# Altium footprint library Power_Lib_Altium.PcbLib: 383 footprints (part 17 of 24)
Each footprint in its own frame and in the unit in brackets; x right, y up, seen from the top. Pads: shape width x height; smd on the part's side, far side on the other; paste and mask are expansions set on the pad; w line width, h text height; cw(c..) or ccw(c..) is an arc to the next point about the centre after c.
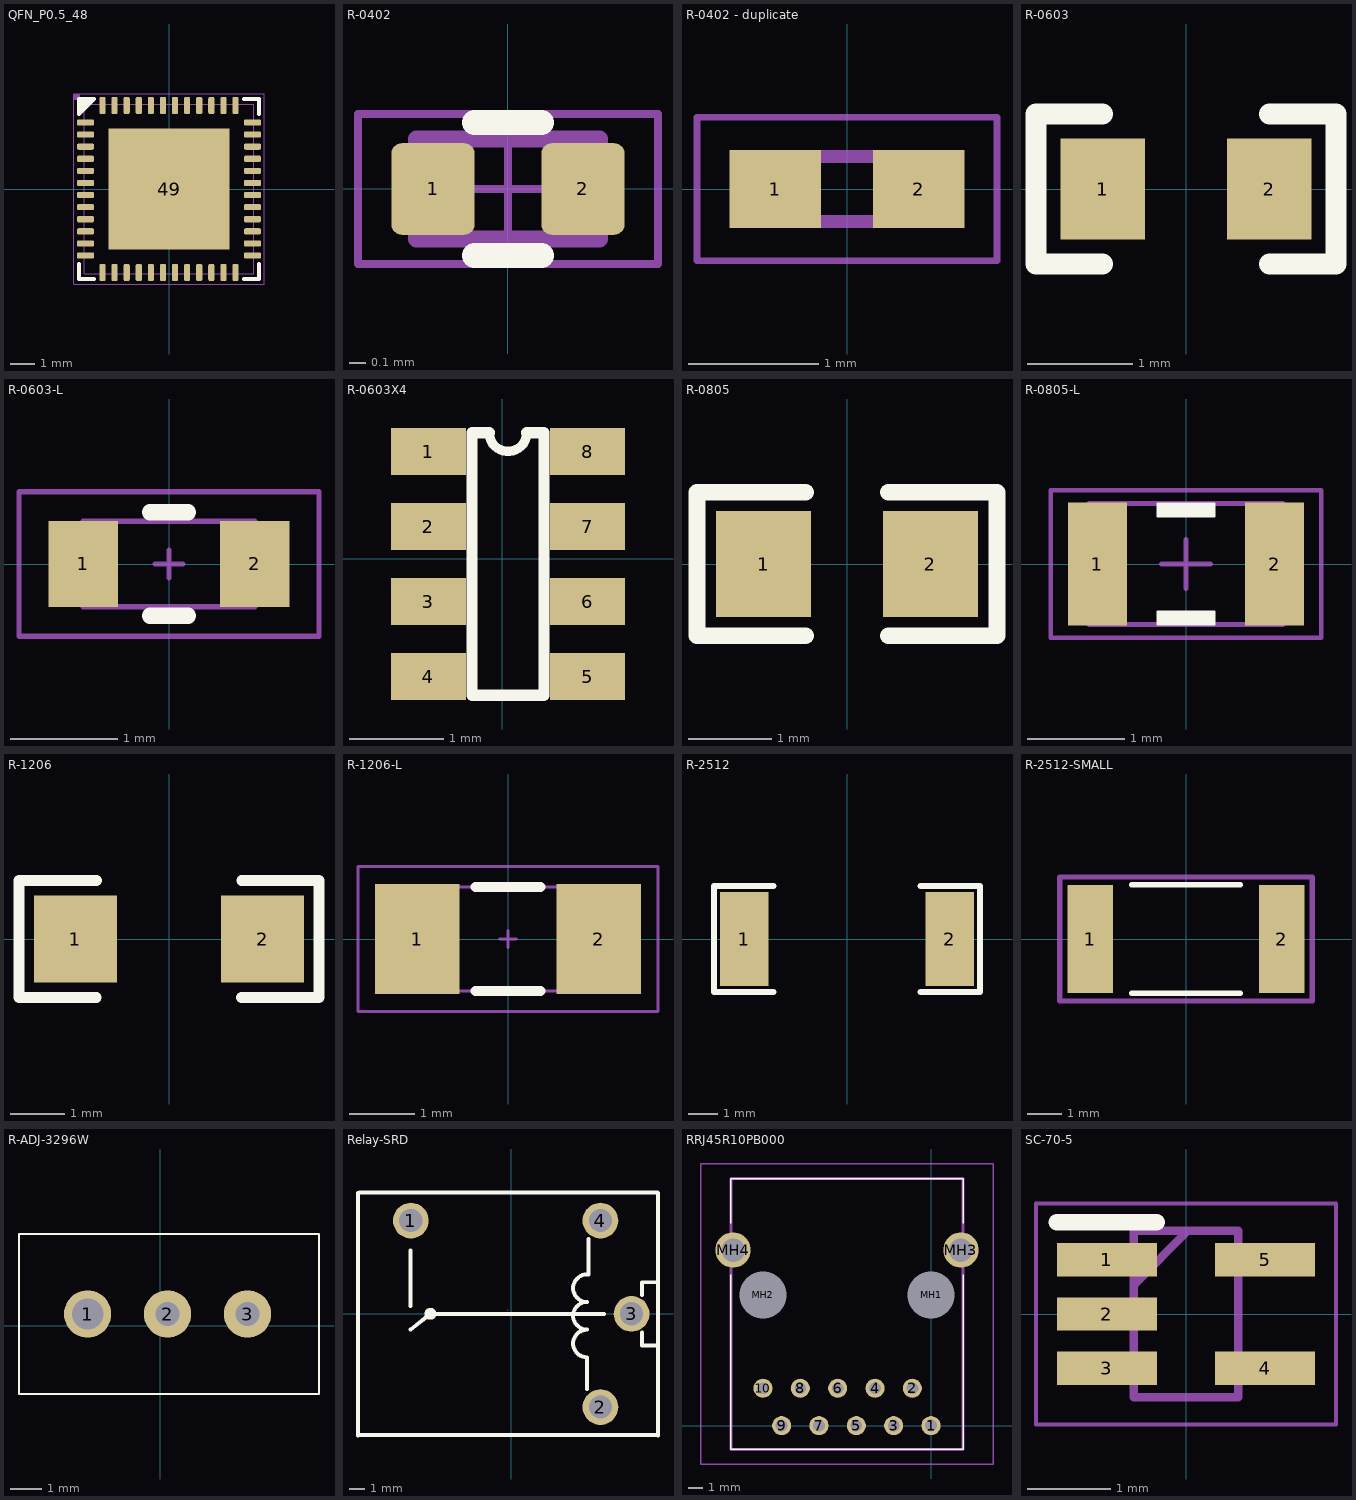
[diagram p16: the footprints below, top view; thin cyan lines are the x and y axes]

## QFN_P0.5_48 [mil]
height 21.65
pads (49):
  rrect50% 28x10 smd: 1(-136,108.27) 2(-136,88.58) 3(-136,68.9) 4(-136,49.21) 5(-136,29.53) 6(-136,9.84) 7(-136,-9.84) 8(-136,-29.53) 9(-136,-49.21) 10(-136,-68.9) 11(-136,-88.58) 12(-136,-108.27) 25(136,-108.27) 26(136,-88.58) 27(136,-68.9) 28(136,-49.21) 29(136,-29.53) 30(136,-9.84) 31(136,9.84) 32(136,29.53) 33(136,49.21) 34(136,68.9) 35(136,88.58) 36(136,108.27)
  rrect50% 10x28 smd: 13(-108.27,-136) 14(-88.58,-136) 15(-68.9,-136) 16(-49.21,-136) 17(-29.53,-136) 18(-9.84,-136) 19(9.84,-136) 20(29.53,-136) 21(49.21,-136) 22(68.9,-136) 23(88.58,-136) 24(108.27,-136) 37(108.27,136) 38(88.58,136) 39(68.9,136) 40(49.21,136) 41(29.53,136) 42(9.84,136) 43(-9.84,136) 44(-29.53,136) 45(-49.21,136) 46(-68.9,136) 47(-88.58,136) 48(-108.27,136)
  rect 196.85x196.85 smd: 49(0,0)
Top Overlay:
  region: -146.67,146.67 -122,146.67 -146.67,122
  lines w6: -146.67,-122 -146.67,-146.67 -122,-146.67 ; 122,-146.67 146.67,-146.67 146.67,-122 ; 122,146.67 146.67,146.67 146.67,122 ; -146.67,122 -122,146.67 -146.67,146.67 -146.67,122
Top Solder:
  rectangle: -150,-108.27 -122,108.27
  region: 108.27,-150 108.27,-122 -108.27,-122 -108.27,-150
  region: 150,108.27 122,108.27 122,-108.27 150,-108.27
  region: -108.27,150 -108.27,122 108.27,122 108.27,150
Mechanical 13:
  lines w2: -10,0 10,0 ; 0,-10 0,10 ; -137.79,-137.8 -137.79,137.8 137.8,137.8 137.8,-137.8 -137.79,-137.8
Mechanical 14:
  region: -155,155 -145,155 -145,150 -145,149.01 -145.76,147.17 -147.17,145.76 -149.01,145 -150,145 -155,145
  lines w2: -155,-155 155,-155 155,155 -155,155 -155,-155
3D body "QFN50P700X700X55-48L.step": height 21.65, standoff 0, extent -138.58,-138.58 138.58,138.59

## R-0402 [mm]
pads (2):
  rrect25% 0.5x0.55 smd: 1(-0.45,0) 2(0.45,0)
Top Overlay:
  lines w0.15: -0.2,-0.4 0.2,-0.4 ; -0.2,0.4 0.2,0.4
Top Courtyard:
  lines w0.05: -0.275,0 0.275,0 ; 0,-0.275 0,0.275 ; -0.9,-0.45 0.9,-0.45 0.9,0.45 -0.9,0.45 -0.9,-0.45
Top Assembly:
  lines w0.1: -0.55,-0.3 -0.55,0.3 0.55,0.3 0.55,-0.3 -0.55,-0.3
3D body "CAPC1005X60N EIA 0402.STEP": height 0.6, standoff 0, extent -0.5,-0.25 0.5,0.25

## R-0402 - duplicate [mm]
pads (2):
  rect 0.7x0.6 smd: 1(-0.55,0) 2(0.55,0)
Mechanical 13:
  lines w0.1: -0.5,-0.25 -0.5,0.25 0.5,0.25 0.5,-0.25 -0.5,-0.25
Mechanical 15:
  lines w0.05: -1.15,-0.55 -1.15,0.55 1.15,0.55 1.15,-0.55 -1.15,-0.55
3D body "CPF0402B10K5E.stp": height 0.35, standoff 0, extent -0.5,-0.25 0.5,0.25

## R-0603 [mm]
pads (2):
  rect 0.8x0.96 smd: 1(-0.79,0) 2(0.79,0)
Top Overlay:
  lines w0.2: -0.79,-0.711 -1.422,-0.711 -1.422,0.711 -0.79,0.711 ; 0.79,-0.711 1.422,-0.711 1.422,0.711 0.79,0.711
3D body "R_0603.STEP": height 0.41, standoff -0.01, extent -0.762,-0.381 0.762,0.381

## R-0603-L [mm]
height 0.35
pads (2):
  rect 0.65x0.8 smd: 1(-0.8,0) 2(0.8,0)
Top Overlay:
  lines w0.152: -0.178,-0.483 0.178,-0.483 ; -0.178,0.483 0.178,0.483
Mechanical 13:
  lines w0.051: -0.127,0 0.127,0 ; 0,-0.127 0,0.127 ; -0.8,-0.4 -0.8,0.4 0.8,0.4 0.8,-0.4 -0.8,-0.4
Mechanical 14:
  lines w0.051: -1.4,-0.675 -1.4,0.675 1.4,0.675 1.4,-0.675 -1.4,-0.675
3D body "RESC1608X05L.step": height 0.45, standoff 0, extent -0.8,-0.4 0.8,0.4

## R-0603X4 [mm]
pads (8):
  rect 0.8x0.5 smd: 1(-0.787,1.143) 2(-0.787,0.343) 3(-0.787,-0.457) 4(-0.787,-1.257) 5(0.913,-1.257) 6(0.913,-0.457) 7(0.913,0.343) 8(0.913,1.143)
Top Overlay:
  lines w0.1: -0.137,1.343 ccw(c0.063,1.343) 0.263,1.343
  lines w0.12: -0.137,1.343 -0.322,1.343 -0.322,-1.457 0.448,-1.457 0.448,1.343 0.263,1.343
3D body "User Library-R-0603-Array-4-1.SLDPRT": height 0.51, standoff -0.01, extent -0.724,-1.651 0.876,1.549

## R-0805 [mm]
pads (2):
  rect 1.14x1.27 smd: 1(-1.003,0) 2(1.003,0)
Top Overlay:
  lines w0.2: -0.495,-0.864 -1.803,-0.864 -1.803,0.864 -0.495,0.864 ; 0.495,-0.864 1.803,-0.864 1.803,0.864 0.495,0.864
3D body "R_0805.STEP": height 0.51, standoff -0.01, extent -1.016,-0.635 1.016,0.635

## R-0805-L [mil]
pads (2):
  rect 24x50 smd: 1(-36,0) 2(36,0)
Top Overlay:
  region: -11.5,24.5 11.5,24.5 11.5,19.5 -11.5,19.5
  region: 11.5,-24.5 -11.5,-24.5 -11.5,-19.5 11.5,-19.5
  lines w1: -11.5,-24.5 -11.5,-19.5 11.5,-19.5 11.5,-24.5 -11.5,-24.5 ; -11.5,19.5 11.5,19.5 11.5,24.5 -11.5,24.5 -11.5,19.5
Mechanical 13:
  lines w2: -10,0 10,0 ; 0,-10 0,10 ; -39.37,-24.61 -39.37,24.61 39.37,24.61 39.37,-24.61 -39.37,-24.61
Mechanical 14:
  lines w2: -55,-30 55,-30 55,30 -55,30 -55,-30
3D body "RESC2012X06L.step": height 23.62, standoff 0, extent -39.37,-24.6 39.37,24.61

## R-1206 [mm]
pads (2):
  rect 1.52x1.6 smd: 1(-1.713,0) 2(1.712,0)
Top Overlay:
  lines w0.2: -1.331,-1.067 -2.743,-1.067 -2.743,1.067 -1.323,1.067 ; 1.322,-1.067 2.743,-1.067 2.743,1.067 1.331,1.067
3D body "R_1206.STEP": height 1.01, standoff -0.01, extent -1.6,-0.8 1.6,0.8

## R-1206-L [mm] "Chip Res, 2-Leads, Body 3.20x1.60mm, IPC Medium Density"
height 1.23
pads (2):
  rect 1.3x1.7 smd: 1(-1.4,0) 2(1.4,0)
Top Overlay:
  lines w0.152: -0.5,-0.8 0.5,-0.8 ; -0.5,0.8 0.5,0.8
Mechanical 13:
  lines w0.051: -0.127,0 0.127,0 ; 0,-0.127 0,0.127 ; -1.6,-0.8 -1.6,0.8 1.6,0.8 1.6,-0.8 -1.6,-0.8
Mechanical 14:
  lines w0.051: -2.311,-1.118 -2.311,1.118 2.311,1.118 2.311,-1.118 -2.311,-1.118
3D body "R_1206.STEP": height 1.01, standoff -0.01, extent -1.6,-0.8 1.6,0.8

## R-2512 [mm]
pads (2):
  rect 1.65x3.2 smd: 1(-3.494,0) 2(3.494,0)
Top Overlay:
  lines w0.2: -2.494,-1.803 -4.521,-1.803 -4.521,1.803 -2.494,1.803 ; 2.494,-1.803 4.521,-1.803 4.521,1.803 2.494,1.803
3D body "R_2512.STEP": height 0.66, standoff -0.01, extent -3.175,-1.6 3.175,1.6

## R-2512-SMALL [mm]
pads (2):
  rect 1.35x3.2 smd: 1(-2.825,0) 2(2.825,0)
Top Overlay:
  lines w0.15: -1.6,-1.6 1.6,-1.6 ; -1.6,1.6 1.6,1.6
Mechanical 14:
  lines w0.15: -3.725,-1.825 -3.725,1.825 3.725,1.825 3.725,-1.825 -3.725,-1.825
3D body "R_2512.STEP": height 0.66, standoff -0.01, extent -3.175,-1.6 3.175,1.6

## R-ADJ-3296W [mm]
pads (3):
  round 1.5 hole 1: 1(-2.306,0.378)
  round 1.5 hole 0.762: 2(0.234,0.378) 3(2.774,0.378)
Top Overlay:
  lines w0.051: -4.445,-2.162 -0.346,-2.162 -4.486,-2.162 -4.486,2.918 -0.346,2.918 ; -1.766,-2.162 4.734,-2.162 ; -1.087,2.918 5.044,2.918 5.044,-2.162 0.774,-2.162 5.029,-2.162 ; -4.306,-2.162 2.194,-2.162 -4.306,-2.162
3D body "User Library-3296W.SLDPRT": height 11.55, standoff -1.6, extent -4.486,-2.032 5.044,2.768

## Relay-SRD [mm] "松乐 SDR 继电器"
pads (4):
  round 2.3 hole 1.5: 1(-6.453,6) 2(5.747,-6) 3(7.747,0) 4(5.747,6)
Top Overlay:
  circle w0.254: c-5.195,0 r0.254
  lines w0.254: -9.855,-7.822 -9.855,7.779 ; -9.772,-7.8 9.428,-7.8 ; -9.772,7.8 9.428,7.8 ; -6.465,-1.016 -5.195,0 5.289,-0.001 5.981,0 ; -6.466,0.507 -6.466,4.063 ; 4.877,-4.826 4.877,-2.794 cw(c4.877,-1.905) 4.877,-1.016 cw(c4.877,-0.127) 4.877,0.762 cw(c4.877,1.651) 4.877,2.54 ; 4.965,2.526 4.965,4.826 ; 8.412,-1.21 8.412,-2.032 9.428,-2.032 ; 8.412,1.21 8.412,2.032 9.428,2.032 ; 9.449,-7.822 9.449,7.779
Mechanical 15:
  lines w0.003: -0.229,0.197 -0.178,0.248
3D body: height 0.25, standoff -20, extent -9.906,-7.747 -9.906,7.747
3D body: height 15.8, standoff 0.25, extent -9.906,-7.747 9.525,7.747

## RRJ45R10PB000 [mm]
pads (14):
  round 1.3 hole 0.8: 1(0,0) 2(-1.27,2.54) 3(-2.54,0) 4(-3.81,2.54) 5(-5.08,0) 6(-6.35,2.54) 7(-7.62,0) 8(-8.89,2.54) 9(-10.16,0) 10(-11.43,2.54)
  round 1.6 hole 3.2 unplated: MH1(0,8.89) MH2(-11.43,8.89)
  round 2.4 hole 1.6: MH3(2.035,11.94) MH4(-13.465,11.94)
Top Overlay:
  lines w0.1: -13.615,-1.61 -13.615,10.25 -13.615,-1.61 ; -13.615,-1.61 2.185,-1.61 ; -13.615,-1.61 2.185,-1.61 ; -13.615,16.79 -13.615,13.75 -13.615,16.79 ; -13.615,16.79 2.185,16.79 ; -13.615,16.79 2.185,16.79 ; 2.185,-1.61 2.185,10.25 2.185,-1.61 ; 2.185,16.79 2.185,13.75 2.185,16.79
Mechanical 13:
  lines w0.2: -13.615,-1.61 -13.615,16.79 2.185,16.79 2.185,-1.61 -13.615,-1.61
Mechanical 15:
  lines w0.1: -15.665,-2.61 -15.665,17.79 4.235,17.79 4.235,-2.61 -15.665,-2.61
3D body "R-RJ45R10P-B000.stp": height 13.45, standoff -5, extent -14.159,-1.61 2.735,16.79

## SC-70-5 [mm]
pads (5):
  rect 1.2x0.4 smd: 1(-0.95,0.65) 2(-0.95,0) 3(-0.95,-0.65) 4(0.95,-0.65) 5(0.95,0.65)
Top Overlay:
  lines w0.2: -1.55,1.1 -0.35,1.1
Mechanical 13:
  lines w0.1: -0.625,0.35 0.025,1 ; -0.625,-1 -0.625,1 0.625,1 0.625,-1 -0.625,-1
Mechanical 15:
  lines w0.05: -1.8,-1.325 -1.8,1.325 1.8,1.325 1.8,-1.325 -1.8,-1.325
3D body "SN74LVC1G08DCKR.stp": height 1.1, standoff 0, extent -1.05,-1 1.05,1